# Altium footprint library MainLibrary.PcbLib: 85 footprints (part 2 of 6)
Each footprint in its own frame and in the unit in brackets; x right, y up, seen from the top. Pads: shape width x height; smd on the part's side, far side on the other; paste and mask are expansions set on the pad; w line width, h text height; cw(c..) or ccw(c..) is an arc to the next point about the centre after c.
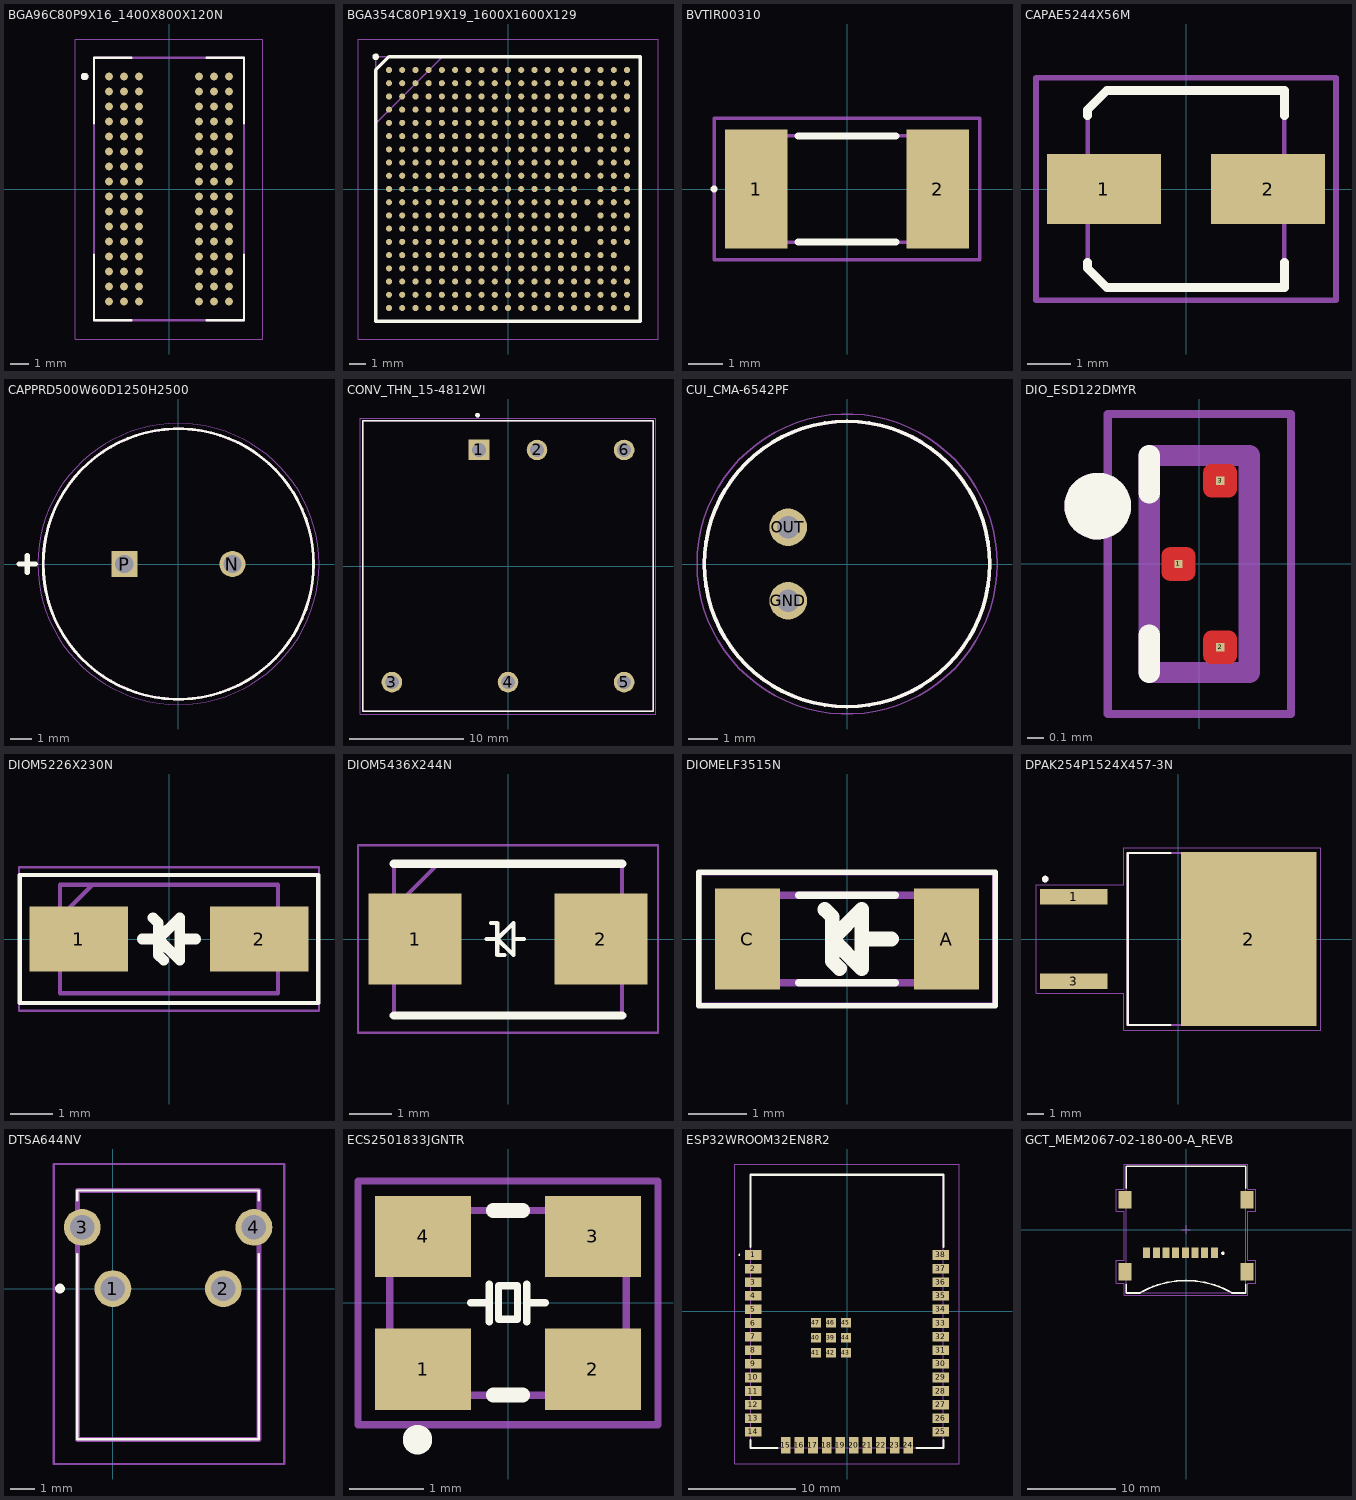
[diagram p1: the footprints below, top view; thin cyan lines are the x and y axes]

## BGA96C80P9X16_1400X800X120N [mm]
pads (96):
  round 0.43 smd: A1(-3.2,6) A2(-2.4,6) A3(-1.6,6) A7(1.6,6) A8(2.4,6) A9(3.2,6) B1(-3.2,5.2) B2(-2.4,5.2) B3(-1.6,5.2) B7(1.6,5.2) B8(2.4,5.2) B9(3.2,5.2) C1(-3.2,4.4) C2(-2.4,4.4) C3(-1.6,4.4) C7(1.6,4.4) C8(2.4,4.4) C9(3.2,4.4) D1(-3.2,3.6) D2(-2.4,3.6) D3(-1.6,3.6) D7(1.6,3.6) D8(2.4,3.6) D9(3.2,3.6) E1(-3.2,2.8) E2(-2.4,2.8) E3(-1.6,2.8) E7(1.6,2.8) E8(2.4,2.8) E9(3.2,2.8) F1(-3.2,2) F2(-2.4,2) F3(-1.6,2) F7(1.6,2) F8(2.4,2) F9(3.2,2) G1(-3.2,1.2) G2(-2.4,1.2) G3(-1.6,1.2) G7(1.6,1.2) G8(2.4,1.2) G9(3.2,1.2) H1(-3.2,0.4) H2(-2.4,0.4) H3(-1.6,0.4) H7(1.6,0.4) H8(2.4,0.4) H9(3.2,0.4) J1(-3.2,-0.4) J2(-2.4,-0.4) J3(-1.6,-0.4) J7(1.6,-0.4) J8(2.4,-0.4) J9(3.2,-0.4) K1(-3.2,-1.2) K2(-2.4,-1.2) K3(-1.6,-1.2) K7(1.6,-1.2) K8(2.4,-1.2) K9(3.2,-1.2) L1(-3.2,-2) L2(-2.4,-2) L3(-1.6,-2) L7(1.6,-2) L8(2.4,-2) L9(3.2,-2) M1(-3.2,-2.8) M2(-2.4,-2.8) M3(-1.6,-2.8) M7(1.6,-2.8) M8(2.4,-2.8) M9(3.2,-2.8) N1(-3.2,-3.6) N2(-2.4,-3.6) N3(-1.6,-3.6) N7(1.6,-3.6) N8(2.4,-3.6) N9(3.2,-3.6) P1(-3.2,-4.4) P2(-2.4,-4.4) P3(-1.6,-4.4) P7(1.6,-4.4) P8(2.4,-4.4) P9(3.2,-4.4) R1(-3.2,-5.2) R2(-2.4,-5.2) R3(-1.6,-5.2) R7(1.6,-5.2) R8(2.4,-5.2) R9(3.2,-5.2) T1(-3.2,-6) T2(-2.4,-6) T3(-1.6,-6) T7(1.6,-6) T8(2.4,-6) T9(3.2,-6)
Top Overlay:
  circle w0.2: c-4.5,6 r0.1
  lines w0.127: -4,-3.5 -4,-7 -2,-7 ; -4,3.5 -4,7 -2,7 ; 2,-7 4,-7 4,-3.5 ; 2,7 4,7 4,3.5
Mechanical 13:
  circle w0.2: c-4.5,6 r0.1
  lines w0.127: -4,-7 4,-7 4,7 -4,7 -4,-7
Mechanical 15:
  lines w0.05: -5,-8 5,-8 5,8 -5,8 -5,-8
3D body "MT41K64M16TW-107_J TR.STEP": height 1.2, standoff 0, extent -4,-7 4,7

## BGA354C80P19X19_1600X1600X129 [mm]
pads (354):
  round 0.37 smd: A1(-7.2,7.2) A2(-6.4,7.2) A3(-5.6,7.2) A4(-4.8,7.2) A5(-4,7.2) A6(-3.2,7.2) A7(-2.4,7.2) A8(-1.6,7.2) A9(-0.8,7.2) A10(0,7.2) A11(0.8,7.2) A12(1.6,7.2) A13(2.4,7.2) A14(3.2,7.2) A15(4,7.2) A16(4.8,7.2) A17(5.6,7.2) A18(6.4,7.2) A19(7.2,7.2) B1(-7.2,6.4) B2(-6.4,6.4) B3(-5.6,6.4) B4(-4.8,6.4) B5(-4,6.4) B6(-3.2,6.4) B7(-2.4,6.4) B8(-1.6,6.4) B9(-0.8,6.4) B10(0,6.4) B11(0.8,6.4) B12(1.6,6.4) B13(2.4,6.4) B14(3.2,6.4) B15(4,6.4) B16(4.8,6.4) B17(5.6,6.4) B18(6.4,6.4) B19(7.2,6.4) C1(-7.2,5.6) C2(-6.4,5.6) C3(-5.6,5.6) C4(-4.8,5.6) C5(-4,5.6) C6(-3.2,5.6) C7(-2.4,5.6) C8(-1.6,5.6) C9(-0.8,5.6) C10(0,5.6) C11(0.8,5.6) C12(1.6,5.6) C13(2.4,5.6) C14(3.2,5.6) C15(4,5.6) C16(4.8,5.6) C17(5.6,5.6) C18(6.4,5.6) C19(7.2,5.6) D1(-7.2,4.8) D2(-6.4,4.8) D3(-5.6,4.8) D4(-4.8,4.8) D5(-4,4.8) D6(-3.2,4.8) D7(-2.4,4.8) D8(-1.6,4.8) D9(-0.8,4.8) D10(0,4.8) D11(0.8,4.8) D12(1.6,4.8) D13(2.4,4.8) D14(3.2,4.8) D15(4,4.8) D16(4.8,4.8) D17(5.6,4.8) D18(6.4,4.8) D19(7.2,4.8) E1(-7.2,4) E2(-6.4,4) E3(-5.6,4) E4(-4.8,4) E5(-4,4) E6(-3.2,4) E7(-2.4,4) E8(-1.6,4) E9(-0.8,4) E10(0,4) E11(0.8,4) E12(1.6,4) E13(2.4,4) E14(3.2,4) E15(4,4) E16(4.8,4) E17(5.6,4) E18(6.4,4) F1(-7.2,3.2) F2(-6.4,3.2) F3(-5.6,3.2) F4(-4.8,3.2) F5(-4,3.2) F6(-3.2,3.2) F7(-2.4,3.2) F8(-1.6,3.2) F9(-0.8,3.2) F10(0,3.2) F11(0.8,3.2) F12(1.6,3.2) F13(2.4,3.2) F14(3.2,3.2) F15(4,3.2) F17(5.6,3.2) F18(6.4,3.2) F19(7.2,3.2) G1(-7.2,2.4) G2(-6.4,2.4) G3(-5.6,2.4) G4(-4.8,2.4) G5(-4,2.4) G6(-3.2,2.4) G7(-2.4,2.4) G8(-1.6,2.4) G9(-0.8,2.4) G10(0,2.4) G11(0.8,2.4) G12(1.6,2.4) G13(2.4,2.4) G14(3.2,2.4) G15(4,2.4) G16(4.8,2.4) G17(5.6,2.4) G18(6.4,2.4) G19(7.2,2.4) H1(-7.2,1.6) H2(-6.4,1.6) H3(-5.6,1.6) H4(-4.8,1.6) H5(-4,1.6) H6(-3.2,1.6) H7(-2.4,1.6) H8(-1.6,1.6) H9(-0.8,1.6) H10(0,1.6) H11(0.8,1.6) H12(1.6,1.6) H13(2.4,1.6) H14(3.2,1.6) H15(4,1.6) H17(5.6,1.6) H18(6.4,1.6) H19(7.2,1.6) J1(-7.2,0.8) J2(-6.4,0.8) J3(-5.6,0.8) J4(-4.8,0.8) J5(-4,0.8) J6(-3.2,0.8) J7(-2.4,0.8) J8(-1.6,0.8) J9(-0.8,0.8) J10(0,0.8) J11(0.8,0.8) J12(1.6,0.8) J13(2.4,0.8) J14(3.2,0.8) J15(4,0.8) J16(4.8,0.8) J17(5.6,0.8) J18(6.4,0.8) J19(7.2,0.8) K1(-7.2,0) K2(-6.4,0) K3(-5.6,0) K4(-4.8,0) K5(-4,0) K6(-3.2,0) K7(-2.4,0) K8(-1.6,0) K9(-0.8,0) K10(0,0) K11(0.8,0) K12(1.6,0) K13(2.4,0) K14(3.2,0) K15(4,0) K17(5.6,0) K18(6.4,0) K19(7.2,0) L1(-7.2,-0.8) L2(-6.4,-0.8) L3(-5.6,-0.8) L4(-4.8,-0.8) L5(-4,-0.8) L6(-3.2,-0.8) L7(-2.4,-0.8) L8(-1.6,-0.8) L9(-0.8,-0.8) L10(0,-0.8) L11(0.8,-0.8) L12(1.6,-0.8) L13(2.4,-0.8) L14(3.2,-0.8) L15(4,-0.8) L16(4.8,-0.8) L17(5.6,-0.8) L18(6.4,-0.8) L19(7.2,-0.8) M1(-7.2,-1.6) M2(-6.4,-1.6) M3(-5.6,-1.6) M4(-4.8,-1.6) M5(-4,-1.6) M6(-3.2,-1.6) M7(-2.4,-1.6) M8(-1.6,-1.6) M9(-0.8,-1.6) M10(0,-1.6) M11(0.8,-1.6) M12(1.6,-1.6) M13(2.4,-1.6) M14(3.2,-1.6) M15(4,-1.6) M17(5.6,-1.6) M18(6.4,-1.6) M19(7.2,-1.6) N1(-7.2,-2.4) N2(-6.4,-2.4) N3(-5.6,-2.4) N4(-4.8,-2.4) N5(-4,-2.4) N6(-3.2,-2.4) N7(-2.4,-2.4) N8(-1.6,-2.4) N9(-0.8,-2.4) N10(0,-2.4) N11(0.8,-2.4) N12(1.6,-2.4) N13(2.4,-2.4) N14(3.2,-2.4) N15(4,-2.4) N16(4.8,-2.4) N17(5.6,-2.4) N18(6.4,-2.4) N19(7.2,-2.4) P1(-7.2,-3.2) P2(-6.4,-3.2) P3(-5.6,-3.2) P4(-4.8,-3.2) P5(-4,-3.2) P6(-3.2,-3.2) P7(-2.4,-3.2) P8(-1.6,-3.2) P9(-0.8,-3.2) P10(0,-3.2) P11(0.8,-3.2) P12(1.6,-3.2) P13(2.4,-3.2) P14(3.2,-3.2) P15(4,-3.2) P17(5.6,-3.2) P18(6.4,-3.2) P19(7.2,-3.2) R1(-7.2,-4) R2(-6.4,-4) R3(-5.6,-4) R4(-4.8,-4) R5(-4,-4) R6(-3.2,-4) R7(-2.4,-4) R8(-1.6,-4) R9(-0.8,-4) R10(0,-4) R11(0.8,-4) R12(1.6,-4) R13(2.4,-4) R14(3.2,-4) R15(4,-4) R16(4.8,-4) R17(5.6,-4) R18(6.4,-4) T1(-7.2,-4.8) T2(-6.4,-4.8) T3(-5.6,-4.8) T4(-4.8,-4.8) T5(-4,-4.8) T6(-3.2,-4.8) T7(-2.4,-4.8) T8(-1.6,-4.8) T9(-0.8,-4.8) T10(0,-4.8) T11(0.8,-4.8) T12(1.6,-4.8) T13(2.4,-4.8) T14(3.2,-4.8) T15(4,-4.8) T16(4.8,-4.8) T17(5.6,-4.8) T18(6.4,-4.8) T19(7.2,-4.8) U1(-7.2,-5.6) U2(-6.4,-5.6) U3(-5.6,-5.6) U4(-4.8,-5.6) U5(-4,-5.6) U6(-3.2,-5.6) U7(-2.4,-5.6) U8(-1.6,-5.6) U9(-0.8,-5.6) U10(0,-5.6) U11(0.8,-5.6) U12(1.6,-5.6) U13(2.4,-5.6) U14(3.2,-5.6) U15(4,-5.6) U16(4.8,-5.6) U17(5.6,-5.6) U18(6.4,-5.6) U19(7.2,-5.6) V1(-7.2,-6.4) V2(-6.4,-6.4) V3(-5.6,-6.4) V4(-4.8,-6.4) V5(-4,-6.4) V6(-3.2,-6.4) V7(-2.4,-6.4) V8(-1.6,-6.4) V9(-0.8,-6.4) V10(0,-6.4) V11(0.8,-6.4) V12(1.6,-6.4) V13(2.4,-6.4) V14(3.2,-6.4) V15(4,-6.4) V16(4.8,-6.4) V17(5.6,-6.4) V18(6.4,-6.4) V19(7.2,-6.4) W1(-7.2,-7.2) W2(-6.4,-7.2) W3(-5.6,-7.2) W4(-4.8,-7.2) W5(-4,-7.2) W6(-3.2,-7.2) W7(-2.4,-7.2) W8(-1.6,-7.2) W9(-0.8,-7.2) W10(0,-7.2) W11(0.8,-7.2) W12(1.6,-7.2) W13(2.4,-7.2) W14(3.2,-7.2) W15(4,-7.2) W16(4.8,-7.2) W17(5.6,-7.2) W18(6.4,-7.2) W19(7.2,-7.2)
Top Overlay:
  circle w0.2: c-8,8 r0.1
  lines w0.2: -8,-8 8,-8 8,8 -7.2,8 -8,7.2 -8,-8
Mechanical 13:
  lines w0.1: -8,3.962 -3.962,8 ; -8,-8 8,-8 8,8 -8,8 -8,-8
Mechanical 15:
  lines w0.05: -9.075,-9.075 9.075,-9.075 9.075,9.075 -9.075,9.075 -9.075,-9.075
3D body "STM32MP151AAB3T.stp": height 1.29, standoff 0, extent -8,-8 8,8

## BVTIR00310 [mm]
pads (2):
  rect 1.8x3.4 smd: 1(-2.6,0) 2(2.6,0)
Top Overlay:
  lines w0.1: -3.86,0 cw(c-3.81,0) -3.76,0 cw(c-3.81,0) -3.86,0
  lines w0.2: -1.4,-1.525 1.4,-1.525 ; -1.4,1.525 1.4,1.525
Mechanical 13:
  lines w0.1: -3.175,-1.525 -3.175,1.525 3.175,1.525 3.175,-1.525 -3.175,-1.525
Mechanical 15:
  lines w0.1: -3.81,-2.032 -3.81,2.032 3.81,2.032 3.81,-2.032 -3.81,-2.032

## CAPAE5244X56M [mm] "Aluminum Electrolytic Capacitor, Body 4,40x4,40x5,60mm, IPC Low Density"
height 5.6
pads (2):
  rect 2.6x1.6 smd: 1(-1.875,0) 2(1.875,0)
Top Overlay:
  lines w0.2: -2.25,-1.675 -2.25,-1.812 -1.813,-2.25 2.25,-2.25 2.25,-1.675 ; -2.25,1.675 -2.25,1.813 -1.813,2.25 2.25,2.25 2.25,1.675
Mechanical 13:
  lines w0.1: -2.25,-1.812 -1.813,-2.25 2.25,-2.25 2.25,2.25 -1.813,2.25 -2.25,1.813 -2.25,-1.812
Mechanical 15:
  lines w0.127: -3.429,-2.54 3.429,-2.54 3.429,2.54 -3.429,2.54 -3.429,-2.54
3D body: height 1.87, standoff 0, extent -2.25,-2.25 2.25,2.25
3D body: height 5.6, standoff 0, extent -2.25,-2.25 2.25,2.25

## CAPPRD500W60D1250H2500 [mm]
pads (2):
  round 1.2 hole 0.85: N(2.5,0)
  rect 1.2x1.2 hole 0.85: P(-2.5,0)
Top Overlay:
  circle w0.127: c0,0 r6.25
  lines w0.254: -7.366,0 -6.604,0 ; -6.985,-0.381 -6.985,0.381
Mechanical 13:
  circle w0.127: c0,0 r6.25
Mechanical 15:
  circle w0.05: c0,0 r6.5
3D body "step_temp.STEP": height 25, standoff -17, extent -6.25,-6.237 6.25,6.237

## CONV_THN_15-4812WI [mm]
pads (6):
  rect 1.8x1.8 hole 1.2: 1(-2.54,10.16)
  round 1.8 hole 1.2: 2(2.54,10.16) 3(-10.16,-10.16) 4(0,-10.16) 5(10.16,-10.16) 6(10.16,10.16)
Top Overlay:
  circle w0.2: c-2.667,13.208 r0.1
  lines w0.127: -12.7,-12.7 -12.7,12.7 12.7,12.7 12.7,-12.7 -12.7,-12.7
Mechanical 13:
  circle w0.2: c-2.667,13.208 r0.1
  lines w0.127: -12.7,-12.7 -12.7,12.7 12.7,12.7 12.7,-12.7 -12.7,-12.7
Mechanical 15:
  lines w0.05: -12.95,-12.95 -12.95,12.95 12.95,12.95 12.95,-12.95 -12.95,-12.95
3D body "THN 15-4812WI.STEP": height 10, standoff -5.5, extent -12.7,-12.7 12.7,12.7

## CUI_CMA-6542PF [mm]
pads (2):
  round 1.278 hole 0.77: GND(-2,-1.25) OUT(-2,1.25)
Top Overlay:
  circle w0.127: c0,0 r4.85
Mechanical 13:
  circle w0.127: c0,0 r4.85
Mechanical 15:
  circle w0.05: c0,0 r5.1

## DIO_ESD122DMYR [mm]
height 0.4
pads (3):
  rect 0.05x0.05 smd paste-1 mask+0: 1(-0.125,0) 2(0.125,-0.5) 3(0.125,0.5)
Top Layer:
  region: 0.183,0.599 0.185,0.599 0.188,0.598 0.19,0.598 0.193,0.597 0.195,0.596 0.198,0.595 0.2,0.593 0.202,0.592 0.204,0.59 0.206,0.589 0.208,0.587 0.21,0.585 0.212,0.583 0.214,0.581 0.215,0.579 0.217,0.577 0.218,0.575 0.22,0.573 0.221,0.57 0.222,0.568 0.223,0.565 0.223,0.563 0.224,0.56 0.224,0.558 0.225,0.555 0.225,0.553 0.225,0.55 0.225,0.45 0.225,0.447 0.225,0.445 0.224,0.442 0.224,0.44 0.223,0.437 0.223,0.435 0.222,0.432 0.221,0.43 0.22,0.427 0.218,0.425 0.217,0.423 0.215,0.421 0.214,0.419 0.212,0.417 0.21,0.415 0.208,0.413 0.206,0.411 0.204,0.41 0.202,0.408 0.2,0.407 0.198,0.405 0.195,0.404 0.193,0.403 0.19,0.402 0.188,0.402 0.185,0.401 0.183,0.401 0.18,0.4 0.07,0.4 0.067,0.401 0.065,0.401 0.062,0.402 0.06,0.402 0.057,0.403 0.055,0.404 0.052,0.405 0.05,0.407 0.048,0.408 0.046,0.41 0.044,0.411 0.042,0.413 0.04,0.415 0.038,0.417 0.036,0.419 0.035,0.421 0.033,0.423 0.032,0.425 0.03,0.427 0.029,0.43 0.028,0.432 0.027,0.435 0.027,0.437 0.026,0.44 0.026,0.442 0.025,0.445 0.025,0.447 0.025,0.45 0.025,0.55 0.025,0.553 0.025,0.555 0.026,0.558 0.026,0.56 0.027,0.563 0.027,0.565 0.028,0.568 0.029,0.57 0.03,0.573 0.032,0.575 0.033,0.577 0.035,0.579 0.036,0.581 0.038,0.583 0.04,0.585 0.042,0.587 0.044,0.589 0.046,0.59 0.048,0.592 0.05,0.593 0.052,0.595 0.055,0.596 0.057,0.597 0.06,0.598 0.062,0.598 0.065,0.599 0.067,0.599 0.07,0.6 0.18,0.6
  region: 0.183,-0.401 0.185,-0.401 0.188,-0.402 0.19,-0.402 0.193,-0.403 0.195,-0.404 0.198,-0.405 0.2,-0.407 0.202,-0.408 0.204,-0.41 0.206,-0.411 0.208,-0.413 0.21,-0.415 0.212,-0.417 0.214,-0.419 0.215,-0.421 0.217,-0.423 0.218,-0.425 0.22,-0.427 0.221,-0.43 0.222,-0.432 0.223,-0.435 0.223,-0.437 0.224,-0.44 0.224,-0.442 0.225,-0.445 0.225,-0.447 0.225,-0.45 0.225,-0.55 0.225,-0.553 0.225,-0.555 0.224,-0.558 0.224,-0.56 0.223,-0.563 0.223,-0.565 0.222,-0.568 0.221,-0.57 0.22,-0.573 0.218,-0.575 0.217,-0.577 0.215,-0.579 0.214,-0.581 0.212,-0.583 0.21,-0.585 0.208,-0.587 0.206,-0.589 0.204,-0.59 0.202,-0.592 0.2,-0.593 0.198,-0.595 0.195,-0.596 0.193,-0.597 0.19,-0.598 0.188,-0.598 0.185,-0.599 0.183,-0.599 0.18,-0.6 0.07,-0.6 0.067,-0.599 0.065,-0.599 0.062,-0.598 0.06,-0.598 0.057,-0.597 0.055,-0.596 0.052,-0.595 0.05,-0.593 0.048,-0.592 0.046,-0.59 0.044,-0.589 0.042,-0.587 0.04,-0.585 0.038,-0.583 0.036,-0.581 0.035,-0.579 0.033,-0.577 0.032,-0.575 0.03,-0.573 0.029,-0.57 0.028,-0.568 0.027,-0.565 0.027,-0.563 0.026,-0.56 0.026,-0.558 0.025,-0.555 0.025,-0.553 0.025,-0.55 0.025,-0.45 0.025,-0.447 0.025,-0.445 0.026,-0.442 0.026,-0.44 0.027,-0.437 0.027,-0.435 0.028,-0.432 0.029,-0.43 0.03,-0.427 0.032,-0.425 0.033,-0.423 0.035,-0.421 0.036,-0.419 0.038,-0.417 0.04,-0.415 0.042,-0.413 0.044,-0.411 0.046,-0.41 0.048,-0.408 0.05,-0.407 0.052,-0.405 0.055,-0.404 0.057,-0.403 0.06,-0.402 0.062,-0.402 0.065,-0.401 0.067,-0.401 0.07,-0.4 0.18,-0.4
  region: -0.067,0.099 -0.065,0.099 -0.062,0.098 -0.06,0.098 -0.057,0.097 -0.055,0.096 -0.052,0.095 -0.05,0.093 -0.048,0.092 -0.046,0.09 -0.044,0.089 -0.042,0.087 -0.04,0.085 -0.038,0.083 -0.036,0.081 -0.035,0.079 -0.033,0.077 -0.032,0.075 -0.03,0.073 -0.029,0.07 -0.028,0.068 -0.027,0.065 -0.027,0.063 -0.026,0.06 -0.026,0.058 -0.025,0.055 -0.025,0.053 -0.025,0.05 -0.025,-0.05 -0.025,-0.053 -0.025,-0.055 -0.026,-0.058 -0.026,-0.06 -0.027,-0.063 -0.027,-0.065 -0.028,-0.068 -0.029,-0.07 -0.03,-0.073 -0.032,-0.075 -0.033,-0.077 -0.035,-0.079 -0.036,-0.081 -0.038,-0.083 -0.04,-0.085 -0.042,-0.087 -0.044,-0.089 -0.046,-0.09 -0.048,-0.092 -0.05,-0.093 -0.052,-0.095 -0.055,-0.096 -0.057,-0.097 -0.06,-0.098 -0.062,-0.098 -0.065,-0.099 -0.067,-0.099 -0.07,-0.1 -0.18,-0.1 -0.183,-0.099 -0.185,-0.099 -0.188,-0.098 -0.19,-0.098 -0.193,-0.097 -0.195,-0.096 -0.198,-0.095 -0.2,-0.093 -0.202,-0.092 -0.204,-0.09 -0.206,-0.089 -0.208,-0.087 -0.21,-0.085 -0.212,-0.083 -0.214,-0.081 -0.215,-0.079 -0.217,-0.077 -0.218,-0.075 -0.22,-0.073 -0.221,-0.07 -0.222,-0.068 -0.223,-0.065 -0.223,-0.063 -0.224,-0.06 -0.224,-0.058 -0.225,-0.055 -0.225,-0.053 -0.225,-0.05 -0.225,0.05 -0.225,0.053 -0.225,0.055 -0.224,0.058 -0.224,0.06 -0.223,0.063 -0.223,0.065 -0.222,0.068 -0.221,0.07 -0.22,0.073 -0.218,0.075 -0.217,0.077 -0.215,0.079 -0.214,0.081 -0.212,0.083 -0.21,0.085 -0.208,0.087 -0.206,0.089 -0.204,0.09 -0.202,0.092 -0.2,0.093 -0.198,0.095 -0.195,0.096 -0.193,0.097 -0.19,0.098 -0.188,0.098 -0.185,0.099 -0.183,0.099 -0.18,0.1 -0.07,0.1
Top Overlay:
  circle w0.2: c-0.61,0.347 r0.1
  lines w0.127: -0.3,-0.65 -0.3,-0.425 ; -0.3,0.425 -0.3,0.65
Top Paste:
  drawing of 3 lines, arcs and shapes, not listed
Top Solder:
  drawing of 3 lines, arcs and shapes, not listed
Mechanical 13:
  circle w0.2: c-0.61,0.347 r0.1
  lines w0.127: -0.3,-0.65 0.3,-0.65 0.3,0.65 -0.3,0.65 -0.3,-0.65
Mechanical 15:
  lines w0.05: -0.55,-0.9 0.55,-0.9 0.55,0.9 -0.55,0.9 -0.55,-0.9
3D body "ESD122DMYR--3DModel-STEP-269445.STEP": height 0.4, standoff 0, extent -0.3,-0.65 0.3,0.65

## DIOM5226X230N [mm]
pads (2):
  rect 2.35x1.55 smd: 1(-2.15,0) 2(2.15,0)
Top Overlay:
  lines w0.1: -3.556,-1.524 3.556,-1.524 3.556,1.524 -3.556,1.524 -3.556,-1.524
  lines w0.254: -0.635,0 -0.254,0 ; -0.381,0.508 -0.254,0.381 -0.254,0 ; -0.127,-0.508 -0.254,-0.381 -0.254,0 ; 0.254,0 0.635,0 ; -0.254,0 0.254,-0.508 0.254,0.508 -0.254,0
Mechanical 13:
  lines w0.1: -2.598,0.518 -1.822,1.292 ; -2.598,-1.292 2.598,-1.292 2.598,1.292 -2.598,1.292 -2.598,-1.292
Mechanical 15:
  lines w0.05: -3.575,-1.71 3.575,-1.71 3.575,1.71 -3.575,1.71 -3.575,-1.71
3D body "SMAJ30A-TP.stp": height 2.26, standoff 0, extent -2.698,-1.403 2.702,1.397

## DIOM5436X244N [mm]
pads (2):
  rect 2.2x2.15 smd: 1(-2.2,0) 2(2.2,0)
Top Overlay:
  lines w0.1: -0.508,0 -0.254,0 ; -0.401,0.381 -0.254,0.381 -0.254,0 ; -0.082,-0.379 -0.252,-0.379 -0.254,-0.381 -0.254,0 ; 0.127,0 0.381,0 ; -0.254,0 0.127,-0.381 0.127,0.381 -0.254,0
  lines w0.2: -2.7,-1.81 2.7,-1.81 ; -2.7,1.778 2.7,1.778
Mechanical 13:
  lines w0.1: -2.7,0.735 -1.625,1.81 ; -2.7,-1.81 -2.7,1.81 2.7,1.81 2.7,-1.81 -2.7,-1.81
Mechanical 15:
  lines w0.05: -3.55,-2.22 -3.55,2.22 3.55,2.22 3.55,-2.22 -3.55,-2.22
3D body "SS26-E3_52T.stp": height 2.44, standoff 0, extent -2.7,-1.81 2.7,1.81

## DIOMELF3515N [mm]
pads (2):
  rect 1.11x1.73 smd: A(1.705,0) C(-1.705,0)
Top Overlay:
  lines w0.1: -2.54,-1.143 2.54,-1.143 2.54,1.143 -2.54,1.143 -2.54,-1.143
  lines w0.127: -0.83,-0.75 0.83,-0.75 ; -0.83,0.75 0.83,0.75
  lines w0.254: -0.381,0.508 -0.254,0.381 -0.254,0 ; -0.127,-0.508 -0.254,-0.381 -0.254,0 ; 0.254,-0.381 0.254,-0.508 ; 0.254,0 0.762,0 ; -0.254,0 0.254,0.508 0.254,-0.508 ; -0.254,0 0.254,-0.508
Mechanical 13:
  lines w0.127: -1.75,-0.75 -1.75,0.75 1.75,0.75 1.75,-0.75 -1.75,-0.75
Mechanical 15:
  lines w0.05: -2.51,-1.115 -2.51,1.115 2.51,1.115 2.51,-1.115 -2.51,-1.115
3D body "BZV55C47 L1.STEP": height 1.6, standoff 0, extent -1.75,-0.762 1.75,0.826

## DPAK254P1524X457-3N [mm]
height 4.57
pads (3):
  rect 4.05x0.94 smd: 1(-6.27,2.54) 3(-6.27,-2.54)
  rect 8.12x10.48 smd paste-6: 2(4.23,0)
Top Overlay:
  circle w0.2: c-8,3.6 r0.1
  lines w0.127: -0.48,-5.16 -3.04,-5.16 -3.04,5.16 -0.48,5.16
Top Paste:
  region: 5.025,-0.715 3.435,-0.715 3.435,0.715 5.025,0.715
  region: 5.025,1.385 3.435,1.385 3.435,2.815 5.025,2.815
  region: 5.025,3.485 3.435,3.485 3.435,4.915 5.025,4.915
  region: 5.025,-2.815 3.435,-2.815 3.435,-1.385 5.025,-1.385
  region: 5.025,-4.915 3.435,-4.915 3.435,-3.485 5.025,-3.485
  region: 2.315,-0.715 0.725,-0.715 0.725,0.715 2.315,0.715
  region: 2.315,1.385 0.725,1.385 0.725,2.815 2.315,2.815
  region: 2.315,3.485 0.725,3.485 0.725,4.915 2.315,4.915
  region: 7.735,3.485 6.145,3.485 6.145,4.915 7.735,4.915
  region: 7.735,1.385 6.145,1.385 6.145,2.815 7.735,2.815
  region: 7.735,-0.715 6.145,-0.715 6.145,0.715 7.735,0.715
  region: 7.735,-2.815 6.145,-2.815 6.145,-1.385 7.735,-1.385
  region: 2.315,-4.915 0.725,-4.915 0.725,-3.485 2.315,-3.485
  region: 2.315,-2.815 0.725,-2.815 0.725,-1.385 2.315,-1.385
  region: 7.735,-4.915 6.145,-4.915 6.145,-3.485 7.735,-3.485
Mechanical 13:
  circle w0.2: c-8,3.6 r0.1
  lines w0.127: -3.04,-5.16 -3.04,5.16 6.42,5.16 6.42,-5.16 -3.04,-5.16
Mechanical 15:
  lines w0.05: -8.55,-3.26 -8.55,3.26 -3.29,3.26 -3.29,5.49 8.54,5.49 8.54,-5.49 -3.29,-5.49 -3.29,-3.26 -8.55,-3.26
3D body "step_temp.STEP": height 4.83, standoff 0, extent -7.626,-5.03 7.614,5.03

## DTSA644NV [mm]
pads (4):
  round 1.5 hole 1: 1(0,0) 2(4.5,0) 3(-1.25,2.5) 4(5.75,2.5)
Top Overlay:
  lines w0.1: -1.45,1.4 -1.45,-6.15 5.95,-6.15 5.95,1.4 ; -1.45,3.6 -1.45,4 5.95,4 5.95,3.6
  lines w0.2: -2.159,-0.1 ccw(c-2.159,0) -2.159,0.1 ccw(c-2.159,0) -2.159,-0.1
Mechanical 13:
  lines w0.2: -1.45,-6.15 -1.45,4 5.95,4 5.95,-6.15 -1.45,-6.15
Mechanical 15:
  lines w0.1: -2.413,-7.15 6.985,-7.15 6.985,5.08 -2.413,5.08 -2.413,-7.15
3D body "DTSA-644N-V.stp": height 7.54, standoff -3.41, extent -1.889,-6.1 6.589,4.05

## ECS2501833JGNTR [mm]
pads (4):
  rect 1.3x1.1 smd: 1(-1.15,-0.9) 2(1.15,-0.9) 3(1.15,0.9) 4(-1.15,0.9)
Top Overlay:
  lines w0.1: -0.508,0 -0.254,0 -0.254,0.254 -0.254,-0.254 ; 0.254,-0.254 0.254,0.254 ; 0.254,0 0.508,0 ; -0.129,-0.22 -0.129,0.232 0.128,0.232 0.128,-0.22 -0.129,-0.22
  lines w0.2: -0.2,-1.25 0.2,-1.25 ; -0.2,1.25 0.2,1.25 ; -1.226,-1.954 ccw(c-1.226,-1.854) -1.226,-1.754 ccw(c-1.226,-1.854) -1.226,-1.954
Mechanical 13:
  lines w0.1: -1.6,-1.25 -1.6,1.25 1.6,1.25 1.6,-1.25 -1.6,-1.25
Mechanical 15:
  lines w0.1: -2.032,-1.651 -2.032,1.651 2.032,1.651 2.032,-1.651 -2.032,-1.651
3D body "ECS-250-18-33-JGN-TR.STEP": height 0.8, standoff 0, extent -1.6,-1.27 1.6,1.23

## ESP32WROOM32EN8R2 [mm]
pads (47):
  rect 1.5x0.9 smd: 1(-8.75,5.26) 2(-8.75,3.99) 3(-8.75,2.72) 4(-8.75,1.45) 5(-8.75,0.18) 6(-8.75,-1.09) 7(-8.75,-2.36) 8(-8.75,-3.63) 9(-8.75,-4.9) 10(-8.75,-6.17) 11(-8.75,-7.44) 12(-8.75,-8.71) 13(-8.75,-9.98) 14(-8.75,-11.25) 25(8.75,-11.25) 26(8.75,-9.98) 27(8.75,-8.71) 28(8.75,-7.44) 29(8.75,-6.17) 30(8.75,-4.9) 31(8.75,-3.63) 32(8.75,-2.36) 33(8.75,-1.09) 34(8.75,0.18) 35(8.75,1.45) 36(8.75,2.72) 37(8.75,3.99) 38(8.75,5.26)
  rect 0.9x1.5 smd: 15(-5.715,-12.5) 16(-4.445,-12.5) 17(-3.175,-12.5) 18(-1.905,-12.5) 19(-0.635,-12.5) 20(0.635,-12.5) 21(1.905,-12.5) 22(3.175,-12.5) 23(4.445,-12.5) 24(5.715,-12.5)
  rect 0.9x0.9 smd: 39(-1.5,-2.46) 40(-2.9,-2.46) 41(-2.9,-3.86) 42(-1.5,-3.86) 43(-0.1,-3.86) 44(-0.1,-2.46) 45(-0.1,-1.06) 46(-1.5,-1.06) 47(-2.9,-1.06)
Top Overlay:
  lines w0.1: -10.1,5.26 cw(c-10.05,5.26) -10,5.26 cw(c-10.05,5.26) -10.1,5.26
  lines w0.2: -9,-12 -9,-12.75 -6.5,-12.75 ; -9,6 -9,12.75 9,12.75 9,6 ; 6.5,-12.75 9,-12.75 9,-12
Mechanical 15:
  lines w0.1: -9,-12.75 -9,12.75 9,12.75 9,-12.75 -9,-12.75
Mechanical 20:
  lines w0.1: -10.5,-14.25 -10.5,13.75 10.5,13.75 10.5,-14.25 -10.5,-14.25
3D body "ESP32-WROOM-32E-N8R2.STEP": height 3.25, standoff 0, extent -9,-12.75 9,12.75

## GCT_MEM2067-02-180-00-A_REVB [mm]
pads (12):
  rect 0.8x1.2 smd: 1(3.225,-2.625) 2(2.125,-2.625) 3(1.025,-2.625) 4(-0.075,-2.625) 5(-1.175,-2.625) 6(-2.275,-2.625) 7(-3.375,-2.625) 8(-4.475,-2.625)
  rect 1.5x2 smd: SHIELD(-6.945,-4.825) SHIELD(-6.945,3.375) SHIELD(6.945,-4.825) SHIELD(6.945,3.375)
Top Overlay:
  circle w0.2: c4.2,-2.7 r0.1
  lines w0.2: -6.8,-6.275 -6.8,-7.225 -5.25,-7.225 ; -6.8,4.725 -6.8,7.225 6.8,7.225 6.8,4.725 ; -5.226,-7.211 cw(c0,-16.264) 5.226,-7.211 ; 5.25,-7.225 6.8,-7.225 6.8,-6.275
Mechanical 13:
  lines w0.1: -6.8,2.77 -7.3,2.77 -7.3,3.97 -6.8,3.97 ; -0.5,0 0.5,0 ; 0,-0.5 0,0.5 ; -6.8,-5.4 -7.3,-5.4 -7.3,-4.2 -6.8,-4.2 ; -6.8,-5.4 -6.8,-4.2 ; -6.8,-5.4 -6.8,-7.225 6.8,-7.225 6.8,-5.4 ; -6.8,-4.2 -6.8,7.225 6.8,7.225 6.8,3.97 ; 6.8,-5.4 6.8,-4.2 ; 6.8,-5.4 7.3,-5.4 7.3,-4.2 6.8,-4.2 ; 6.8,-4.2 6.8,2.77 ; 6.8,2.77 6.8,3.97 ; 6.8,2.77 7.3,2.77 7.3,3.97 6.8,3.97
Mechanical 15:
  lines w0.05: -7.95,-6.096 -7.061,-6.096 -7.061,-7.468 7.061,-7.468 7.061,-6.096 7.95,-6.096 7.95,-3.505 7.061,-3.505 7.061,2.108 7.95,2.108 7.95,4.597 7.061,4.597 7.061,7.468 -7.061,7.468 -7.061,4.597 -7.95,4.597 -7.95,2.108 -7.061,2.108 -7.061,-3.505 -7.95,-3.505 -7.95,-6.096
3D body "MEM2067-02-180-00-A--3DModel-STEP-56544.STEP": height 1.8, standoff 0, extent -7.3,-7.211 7.3,7.239